# Altium footprint library SMT.PcbLib: 325 footprints (part 1 of 21)
Each footprint in its own frame and in the unit in brackets; x right, y up, seen from the top. Pads: shape width x height; smd on the part's side, far side on the other; paste and mask are expansions set on the pad; w line width, h text height; cw(c..) or ccw(c..) is an arc to the next point about the centre after c.
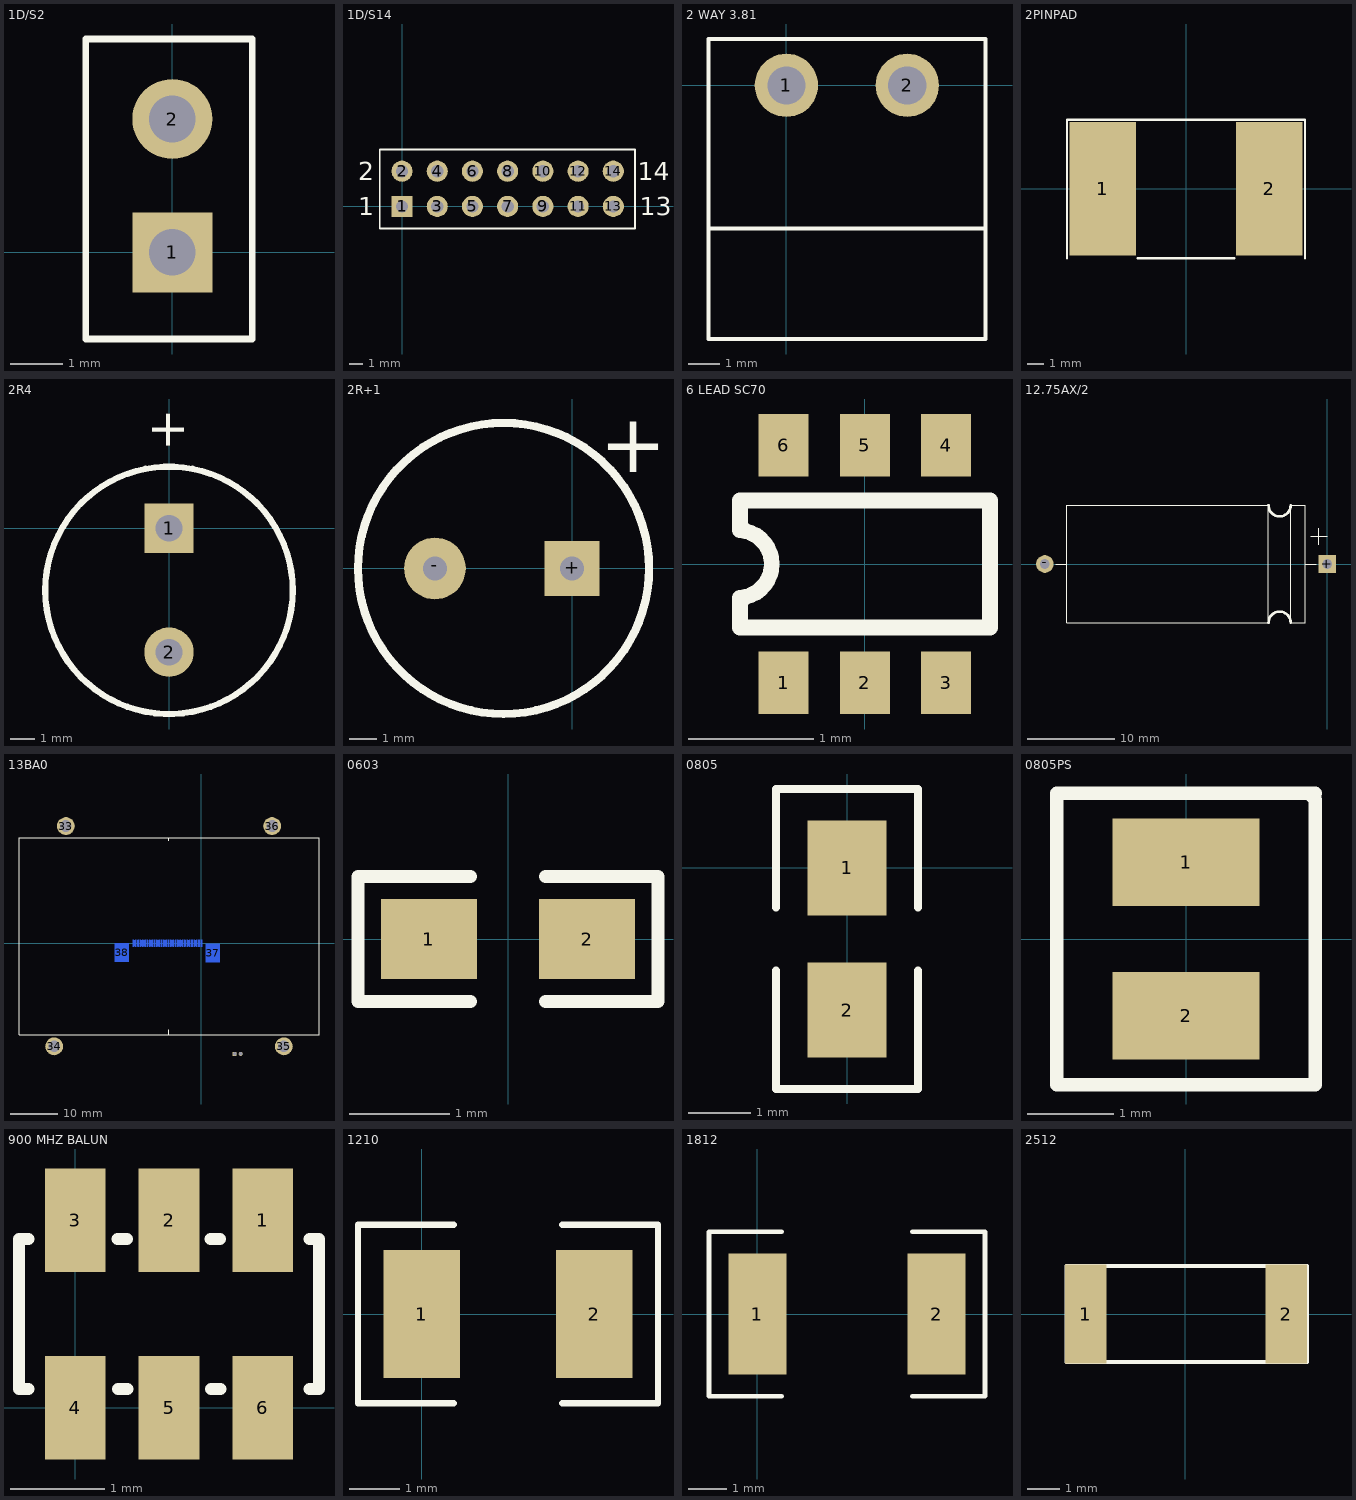
[diagram p0: the footprints below, top view; thin cyan lines are the x and y axes]

## 1D/S2 [mil]
pads (2):
  rect 60x60 hole 35: 1(0,0)
  round 60 hole 35: 2(0,100)
TopOverlay:
  lines w5: -65,-65 -65,160 60,160 60,-65 -65,-65

## 1D/S14 [mil]
pads (14):
  rect 60x60 hole 35: 1(0,0)
  round 60 hole 35: 2(0,100) 3(100,0) 4(100,100) 5(200,0) 6(200,100) 7(300,0) 8(300,100) 9(400,0) 10(400,100) 11(500,0) 12(500,100) 13(600,0) 14(600,100)
TopOverlay:
  lines w5: -63,-63 662,-63 662,162 -63,162 -63,-63
  text "14" at 670,75 h52
  text "1" at -125,-25 h52
  text "2" at -125,75 h52
  text "13" at 675,-25 h52
BottomOverlay:
  text "1" at -38,-25 h52
  text "2" at -38,75 h52
  text "14" at 737,75 h52
  text "13" at 737,-25 h52

## 2 WAY 3.81 [mm]
pads (2):
  round 2 hole 1.2: 1(0,0) 2(3.81,0)
TopOverlay:
  lines w0.127: -2.46,-4.52 6.28,-4.52 ; -2.46,-8 -2.46,0.01 -2.46,1.46 6.2,1.46 6.271,1.46 6.27,-0.01 6.28,-7.33 6.28,-8 6.2,-8 -2.46,-8

## 2PINPAD [mm]
pads (2):
  rect 4x8 smd: 1(-5,0) 2(5,0)
TopOverlay:
  lines w0.127: -7.15,-4.16 -7.15,4.15 7.15,4.15 7.15,-4.16 ; -2.9,-4.16 2.9,-4.16

## 2R4 [mil]
pads (2):
  rect 80x80 hole 43: 1(0,0)
  round 80 hole 43: 2(0,-200)
TopOverlay:
  circle w10: c0,-100 r200
  text "+" at 25,125 h60

## 2R+1 [mil]
pads (2):
  rect 80x80 hole 35: +(0,0)
  round 90 hole 35: -(-200,0)
TopOverlay:
  circle w12: c-100,0 r212
  text "+" at 40,140 h85

## 6 LEAD SC70 [mm] "EIAJ SC88, 1.25mm Wide"
height 1.1
pads (6):
  rect 0.4x0.5 smd: 1(-0.65,-0.95) 2(0,-0.95) 3(0.65,-0.95) 4(0.65,0.95) 5(0,0.95) 6(-0.65,0.95)
TopOverlay:
  lines w0.125: -1,-0.27 ccw(c-1.016,0) -1,0.27
  lines w0.127: -1,-0.27 -1,-0.508 0,-0.508 1,-0.508 1,0.508 0,0.508 -1,0.508 -1,0.27

## 12.75AX/2 [mil]
pads (2):
  rect 80x80 hole 43: +(0,0)
  round 80 hole 43: -(-1275,0)
TopOverlay:
  lines w5: -1225,0 -1175,0 ; -99,0 -49,0 ; -75,125 0,125 ; -37,87 -37,162 ; -1175,-265 -265,-265 -265,265 -1175,265 -1175,-265 ; -165,-265 -100,-265 -100,265 -165,265 -165,-265
  lines w12: -265,-265 cw(c-215,-265) -165,-265 ; -265,265 ccw(c-215,265) -165,265
BottomOverlay:
  lines w5: -186,0 -111,0 ; -148,-37 -148,38

## 13BA0 [mm]
pads (38):
  rect 0.33x1.5 smd far side: 1(0,0)
  oval 0.33x1.5 smd far side: 2(-0.5,0) 3(-1,0) 4(-1.5,0) 5(-2,0) 6(-2.5,0) 7(-3,0) 8(-3.5,0) 9(-4,0) 10(-4.5,0) 11(-5,0) 12(-5.5,0) 13(-6,0) 14(-6.5,0) 15(-7,0) 16(-7.5,0) 17(-8,0) 18(-8.5,0) 19(-9,0) 20(-9.5,0) 21(-10,0) 22(-10.5,0) 23(-11,0) 24(-11.5,0) 25(-12,0) 26(-12.5,0) 27(-13,0) 28(-13.5,0) 29(-14,0) 30(-14.5,0)
  round 0.864 hole 0.711: 31(8.4,-23.6)
  rect 0.864x0.864 hole 0.711: 32(7.1,-23.6)
  round 3.81 hole 2.5: 33(-28.9,25) 34(-31.4,-22) 35(17.6,-22) 36(15.1,25)
  rect 3x4 smd far side: 37(2.4,-2.1) 38(-17,-2)
TopOverlay:
  lines w0.127: -7,-19.5 -7,-18.5 ; -6.9,21.9 -6.9,22.5 ; -38.9,-19.5 -38.9,22.5 25.1,22.5 25.1,-19.5 -38.9,-19.5
BottomOverlay:
  lines w0.127: -16.2,-4.2 -16.2,-5 2.4,-5 2.4,-4.2 ; -15.6,0 -14.1,0 ; -6.9,-5 -6.9,-4.1 ; 0.3,0 1.7,0 ; 6.5,-22.2 5.6,-22.2 5.6,-25.1 10.1,-25.1 10.1,-22.2 9.1,-22.2

## 0603 [mm]
pads (2):
  rect 0.96x0.8 smd: 1(-0.79,0) 2(0.79,0)
TopOverlay:
  lines w0.127: -0.375,-0.625 -1.5,-0.625 -1.5,0.625 -0.375,0.625 ; 0.375,-0.625 1.5,-0.625 1.5,0.625 0.375,0.625
3D body: height 0.45, standoff 0, extent -0.8,-0.4 0.8,0.4

## 0805 [mil]
pads (2):
  rect 50x60 smd: 1(0,0) 2(0,-90)
TopOverlay:
  lines w5: -45,-65 -45,-140 45,-140 45,-65 ; -45,-25 -45,50 45,50 45,-25

## 0805PS [mm] "CHIP INDUCTOR"
height 2
pads (2):
  rect 1.7x1.02 smd: 1(0,0.89) 2(0,-0.89)
TopOverlay:
  lines w0.152: 1.425,1.69 1.5,1.615 1.5,-1.69 -1.5,-1.69 -1.5,1.69 1.5,1.69

## 900 MHZ BALUN [mm]
pads (6):
  rect 0.65x1.1 smd: 1(2,2) 2(1,2) 3(0,2) 4(0,0) 5(1,0) 6(2,0)
TopOverlay:
  lines w0.127: -0.5,0.2 -0.6,0.2 -0.6,1 -0.6,1.8 -0.5,1.8 ; 0.452,1.8 0.552,1.8 ; 0.457,0.2 0.557,0.2 ; 1.443,1.8 1.543,1.8 ; 1.448,0.2 1.548,0.2 ; 2.5,0.2 2.6,0.2 2.6,1 2.6,1.8 2.5,1.8

## 1210 [mil]
pads (2):
  rect 60x100 smd: 1(0,0) 2(135,0)
TopOverlay:
  lines w5: 25,-70 -50,-70 -50,70 25,70 ; 110,-70 185,-70 185,70 110,70

## 1812 [mil]
pads (2):
  rect 60x125 smd: 1(0,0) 2(185,0)
TopOverlay:
  lines w5: 25,-85 -50,-85 -50,85 25,85 ; 160,-85 235,-85 235,85 160,85

## 2512 [mm]
pads (2):
  rect 1.3x3.1 smd: 1(-3.1,0) 2(3.15,0)
TopOverlay:
  lines w0.127: -3.7,-1.5 -3.7,-0.4 -3.7,1.5 3.8,1.5 3.8,-1.5 -3.7,-1.5